# Altium schematic symbol library Sang_library.SchLib: 1607 symbols (part 11 of 15) (continued)
## Relay 5
designator RL?, comment Relay 10A/12V
Relay SPDT,10A - 12VDC 5 Pin; Value: Relay SPDT, 10A, 12V
footprint Relay - SRA-05VDC-CL (15.5 x 12.3 x 14mm)
footprint Relay - SRD-03VDC-SL-C (19.1 x 15.5 x 15.3mm)
pins: 1, 2, 3, 4, 5

## Relay 8
designator RL?
footprint RELAY 8
footprint RELAY 8 - 29*12.7
pins: 1, 2, 3, 4, 5, 6, 7, 8

## Relay 10A
designator RL?, comment MH  (value not drawn)
Cắm; Value: Relay ?V - 10A
footprint RELAY5PIN-10A
footprint RELAY5PIN-10A
pins: 1, 2, 3, 4, 5

## Relay 24V2A G5V
designator K?, comment 24V2A G5V
Cắm; Ten_Linh_Kien: Relay 24V2A 8 Chân G5V-2-24VDC; Don_Vi: Con; Ma_Hang: MH005637; Chung_Loai: Căm; Kieu_Chan: *; Ghi_Chu: *
footprint RELAY-DP
pins: 1, 2, 3, 4, 5, 6, 7, 8
text: +; -

## Relay 24V3A HK4100F
designator RL?, comment 24V3A SHG
Cắm; Ten_Linh_Kien: Relay 24V3A 6 Chân HK4100F-DC24V-SHG; Ma_Hang: MH001685; Don_Vi: Con; Kieu_Chan: *; Ghi_Chu: *; Chung_Loai: Cắm
footprint RELAY 6_MH (RELAY 6)
pins: 1, 2, 3, 4, 5, 6

## RELAY-DPST
designator K?, comment 24V3A SHG
Cắm; Ten_Linh_Kien: Relay 24V3A 6 Chân HK4100F-DC24V-SHG; Don_Vi: Con; Ma_Hang: MH001685; Kieu_Chan: *; Ghi_Chu: *; Chung_Loai: Cắm
pins: 1, 2, 3, 4, 5, 6

## RELAY-SPDT
designator K?, comment 5V10A
Cắm; Ten_Linh_Kien: Relay 5V10A 5 Chân SRD-05VDC-SL-C; Don_Vi: Con; Ma_Hang: MH001007; Kieu_Chan: *; Ghi _Chu: *; Chung_Loai: Cắm
footprint RELAY_5
pins: 1, 2, 3, 4, 5

## RELAY-SPST_n
designator K?, comment 24V10A
Cắm; Ten_Linh_Kien: Relay 24V10A G5Q-1A-DC24V; Don_Vi: Con; Ma_Hang: MH004501; Kieu_Chan: *; Ghi_Chu: *; Chung_Loai: Cắm
pins: 1, 2, 3, 5 4

## RELAY_12V_2A
designator K?, comment RELAY
Relay 8pin, 12V, 2A contact; CompanyID: VT-00250; Solder: HAND; Value: RELAY
footprint RY12W-K (Takamisawa Relay)
pins: 1, 2, 3, 4, 5, 6, 7, 8

## Relay_Module_1
designator *
footprint RELAY MODULE HW-279 2 RELAYS
pins: 1 IN, 2 V-, 3 V+, 4 NO, 5 COM, 6 NC
text: K1

## Res DIP
designator R?, comment Res
DIP; Manufacturer: Generic Components; Class: Passive; SubClass: R; Published: 08/06/2000; Publisher: Altium Hobart Technology Centre
footprint RES-1/2W
footprint RES-1/4W
footprint RES-1/4W-SMALL
footprint RES-1/4WD
footprint RES-1/8W
footprint RES-1/8W-SMALL (R 1/8W, 2 pin, 200mil)
footprint RES-1/8WD
footprint RES-1W
footprint RES-1W-LONG
footprint RES-1WD
footprint RES-2W (R2W, 2 pin, 700mil)
footprint RES-5W (R5W , 2 pin, 400 x 950mil)
footprint RES-5WD (R5W , 2 pin, 300 x 600 mil)
footprint RES-1/8W-SMALL-2 (R 1/8W, 2 pin, 200mil)
pins: 1, 2

## RES NTC DIP
designator R?, comment 10K
THERMISTOR NTC 10KOHM; MPN: 01M1002JF; MFR: Vishay Dale; Solder: Wave; Value: 10K; Category: RESISTOR
footprint RES NTC 10K
pins: 1, 2
text: +t

## Res RN4
designator RPB?, comment 10K
Resistor 4(Thanh); Value: Tro thanh 10K
footprint RN4 (R SIP5, 5 Pin)
pins: 1, 2, 3, 4, 5

## Res RN8
designator RPB?, comment 10K
Resistor 8 (Thanh); Value: Tro thanh 10K
footprint RN8 (R SIP8, 9 Pin)
pins: 1, 2, 3, 4, 5, 6, 7, 8, 9

## Res RN8_Dual
designator RPB?, comment 10K
Resistor 8 (Thanh); Value: Tro thanh 10K
footprint RN8_Dual (1206)
pins: 1, 2, 3, 4, 5, 6, 7, 8, 9, 10, 11, 12, 13, 14, 15, 16

## Res SMD
designator R?, comment Var
SMD; Manufacturer: Generic Components; Class: Passive; Published: 08/06/2000; Publisher: Altium Hobart Technology Centre
footprint RES-SMD-0101
footprint RES-SMD-0201
footprint RES-SMD-0603
footprint RES-SMD-0805
footprint RES-SMD-1206
footprint RES-SMD-1210 (Chip Capacitor, Body 3.2x2.5mm, IPC Medium Density)
footprint RES-SMD-1812 (Chip Capacitor, Body 3.2x2.5mm, IPC Medium Density)
footprint RES-SMD-2010 (Chip Capacitor, Body 3.2x2.5mm, IPC Medium Density)
footprint RES-SMD-2512 (Chip Capacitor, Body 3.2x2.5mm, IPC Medium Density)
footprint RES-SMD-0402
pins: 1, 2

## Res Var RV09
designator R?, comment RV09
Variable Resistor 10K; Value: 10K
footprint RES RV09
pins: 1, 2, 3
1 alternate drawing of the same symbol

## Res VR-DN
designator VR?, comment Var
Dual; Value: Volume Dual 50K
footprint VR-D1 (Volume control Dual)
footprint VR-D2
footprint VR-D3
footprint VR-D4
footprint VR-D5
footprint VR-D6
footprint VR-D7 (7*7mm, 10 position, 2.54mm, horizontal type, THT, Round  Arrow type, red actuator, real code, Tube)
pins: 1, 2, 3, 4, 5, 6
text: G

## Res VR-DP
designator VR?, comment 50K
Dual; Value: Volume Dual 50K
footprint VR-D1 (Volume control Dual)
footprint VR-D2
footprint VR-D3
footprint VR-D4
footprint VR-D5
footprint VR-D6
footprint VR-D7 (7*7mm, 10 position, 2.54mm, horizontal type, THT, Round  Arrow type, red actuator, real code, Tube)
part A pins: 1, 2, 3
part B pins: 4, 5, 6
part A text: G
part B text: G

## Res VR-NS
designator VR?
Var Res
footprint VR097NS
pins: 1, 2, 3, 4 CS1, 5 CS2

## Res VR-S
designator VR?, comment Var
Var Resistor; Value: Volume 50k
footprint VR-S4
footprint VR-S1
footprint VR-S2 (Resistor Variable)
footprint VR-S3 (Variable Resistor)
footprint VR 3x3
footprint RK097
pins: 1, 2, 3
text: G

## RF315-DEND-NOIC
designator C?
Manufacturer: W¨¹rth Elektronik eiSos GmbH; partNo: 613004143121; ComponentLink1 Description: Manufacturer; ComponentLink2 Description: Datasheet; NoPins: 04; Created Date: 29 March 2013; ComponentLink1URL: http://www.we-online.com; ComponentLink2URL: http://katalog.we-online.de/em/datasheet/6130xx143121.pdf; Created by: Karrer Zheng
footprint RF315-SEND-NOIC
pins: 1 DAT, 2 VCC, 3 GND
text: RF315-SE

## RF315-PT2272
designator C?
Manufacturer: W¨¹rth Elektronik eiSos GmbH; partNo: 613004143121; ComponentLink1 Description: Manufacturer; ComponentLink2 Description: Datasheet; NoPins: 04; Created Date: 29 March 2013; ComponentLink1URL: http://www.we-online.com; ComponentLink2URL: http://katalog.we-online.de/em/datasheet/6130xx143121.pdf; Created by: Karrer Zheng
footprint RF315-2272
pins: 1 VT, 2 D3, 3 D2, 4 D1, 5 D0, 6 VCC, 7 GND
text: RF315

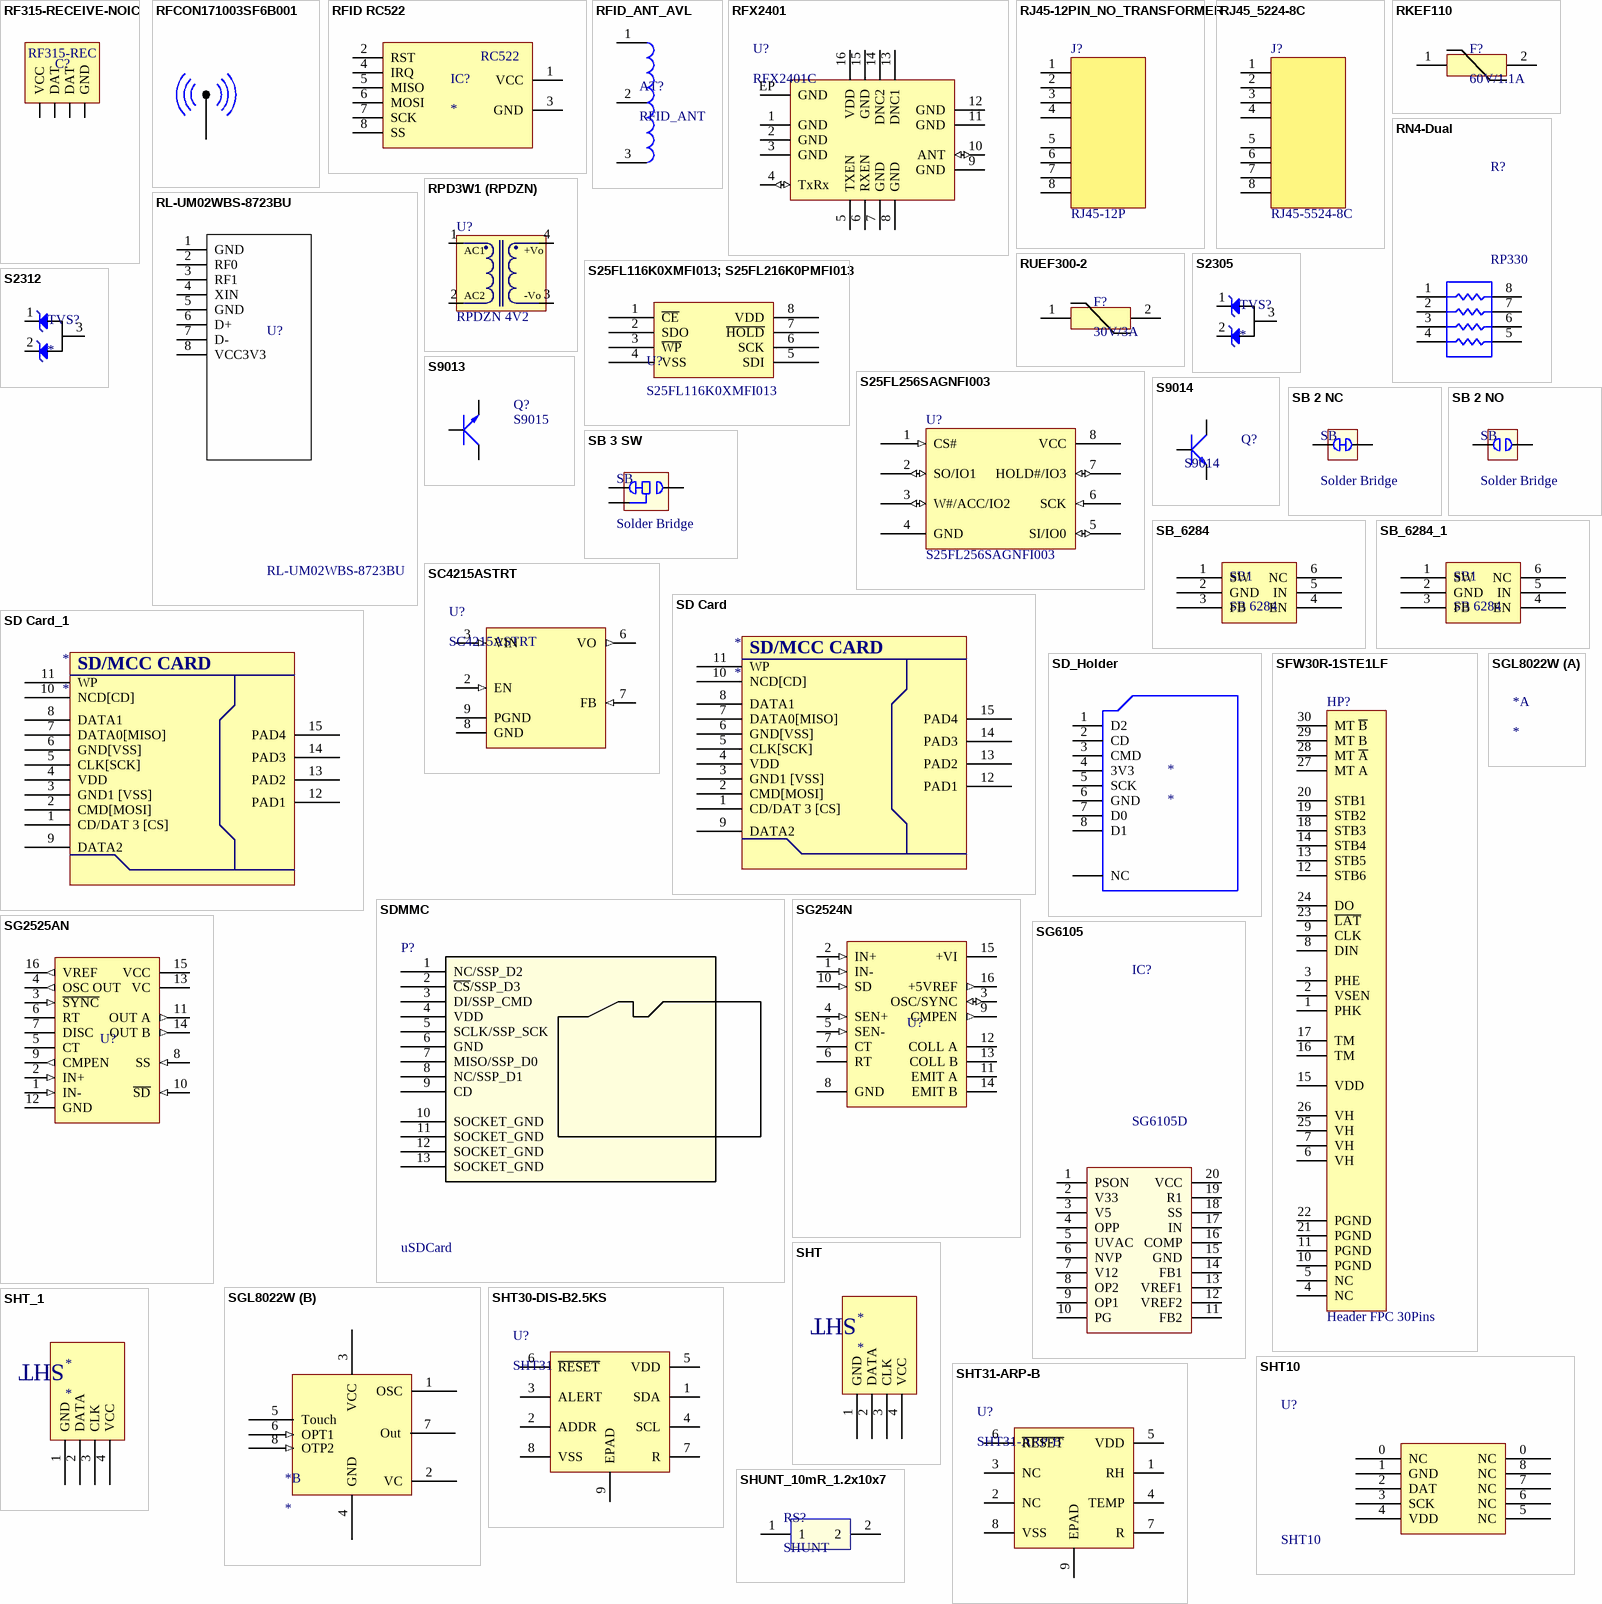
[diagram p69: symbols RF315-RECEIVE-NOIC to SHUNT_10mR_1.2x10x7]

## RF315-RECEIVE-NOIC
designator C?
Manufacturer: W¨¹rth Elektronik eiSos GmbH; partNo: 613004143121; ComponentLink1 Description: Manufacturer; ComponentLink2 Description: Datasheet; NoPins: 04; Created Date: 29 March 2013; ComponentLink1URL: http://www.we-online.com; ComponentLink2URL: http://katalog.we-online.de/em/datasheet/6130xx143121.pdf; Created by: Karrer Zheng
footprint RF315-RECEIVE-NOIC
pins: 1 VCC, 2 DAT, 3 DAT, 4 GND
text: RF315-REC

## RFCON171003SF6B001
designator AT?, comment AT-GSM-GPS  (value not drawn)
CONNECTER ANTENNA GPS GSM; MPN: RFCON171003SF6B001; Solder: HAND; CompanyID: VT-00392; Value: AT-GSM-GPS
footprint ANTENA - SMA2
pins: 1 AT, 2 hidden

## RFID RC522
designator IC?
pins: 1 VCC, 2 RST, 3 GND, 4 IRQ, 5 MISO, 6 MOSI, 7 SCK, 8 SS
text: RC522

## RFID_ANT_AVL
designator AT?, comment RFID_ANT  (net tie, no BOM)
footprint RFID_ANT_AVL (Footprint not found)
pins: 1, 2, 3

## RFX2401
designator U?, comment RFX2401C
2.4 GHz ZigBee®/ISM Front-End Module; Brand: SkyWork; Name VNET: VT_IC_RFX2401C; Part Number: RFX2401C
footprint QFN16 30X30 (QFN, 16-Leads, Body 3.00x3.00mm, Pitch 0.50mm, Thermal Pad 1.70x1.70mm, IPC Medium Density)
pins: 1 GND, 2 GND, 3 GND, 4 TxRx (io), 5 TXEN (power), 6 RXEN (power), 7 GND (power), 8 GND (power), 9 GND (power), 10 ANT (io), 11 GND, 12 GND, 13 DNC1, 14 DNC2, 15 GND, 16 VDD, EP GND (power)

## RJ45-12PIN_NO_TRANSFORMER
designator J?, comment RJ45-12P
Solder: WAVE
footprint RJ45-8PIN_18MM_NO_TRANSFORMER
pins: 1, 2, 3, 4, 5, 6, 7, 8

## RJ45_5224-8C
designator J?, comment RJ45-5524-8C
RJ45-12P; Solder: WAVE; MFR_URL: https://vi.aliexpress.com/item/80PCS-x-RJ45-5224-8C-Plastic-PCB-Modular-jack-Network-socket-LAN-CONNECTOR-plug-180degree-top/32722417191.html
footprint RJ45_5224-8C (Footprint not found)
pins: 1, 2, 3, 4, 5, 6, 7, 8

## RKEF110
designator F?, comment 60V/1.1A
PTC RESET FUSE 60V 1.1A RADIAL; MPN: RKEF110; MFR: Littelfuse Inc.; Solder: WAVE; Value: 60V/1.1A
footprint FUSE-RUEF300 (PTC Resettable Fuses - 3A)
pins: 1, 2

## RL-UM02WBS-8723BU
designator U?
IEEE 802.11b/g/n  1T1R WLAN and Bluetooth; Solder: SMT; MPN: RL-UM02WBS-8723BU; Value: RL-UM02WBS-8723BU; Category: IC
footprint RL-UM02WBS-8723BU
pins: 1 GND, 2 RF0, 3 RF1, 4 XIN, 5 GND, 6 D+, 7 D-, 8 VCC3V3

## RN4-Dual
designator R?, comment RP330
footprint RN4-1206
footprint RN4-0805
footprint RN4-0402 (Resistor network 4 x 1005 (0402))
pins: 1, 2, 3, 4, 5, 6, 7, 8

## RPD3W1 (RPDZN)
designator U?, comment RPDZN 4V2
Ultra-compact module power; MFR: No Brand; Solder: WAVE; Value: 4V2/700mA; Category: MODULE; MFR_URL: https://item.taobao.com/item.htm?spm=a230r.1.14.1.3e96105f3ARyPk&id=527538079756&ns=1&abbucket=16#detail; MPN: RPDZN 4V2; PinCount: 4
footprint RPD3W1 (RPDZN)
pins: 1 AC, 2, 3, 4
text: AC1; +Vo; AC2; -Vo

## RUEF300-2
designator F?, comment 30V/3A
PTC RESET FUSE 30V 3A RADIAL; MPN: RUEF300-2; MFR: Littelfuse Inc.; Solder: WAVE; CompanyID: VT-00887; Value: 30V/3A
footprint FUSE-RUEF300 (PTC Resettable Fuses - 3A)
pins: 1, 2

## S25FL116K0XMFI013; S25FL216K0PMFI013
designator U?, comment S25FL116K0XMFI013
Flash Memory 16Mb 3V 65MHz Serial NOR Flash; MPN: S25FL116K0XMFI013; S25FL216K0PMFI013; Solder: SMT; Value: S25FL116K0XMFI013; Category: IC
pins: 1 ~{CE}, 2 SDO, 3 ~{WP}, 4 VSS (power), 5 SDI, 6 SCK, 7 ~{HOLD}, 8 VDD (power)

## S25FL256SAGNFI003
designator U?
IC FLASH 256MBIT 133MHZ 8WSON; Solder: SMT; MPN: S25FL256SAGNFI003; Value: S25FL256SAGNFI003; Category: IC
footprint WSON-8 (6x8mm)
pins: 1 CS# (in), 2 SO/IO1 (io), 3 W#/ACC/IO2 (io), 4 GND (power), 5 SI/IO0 (io), 6 SCK (in), 7 HOLD#/IO3 (io), 8 VCC (power)

## S2305
designator TVS?
TVS DIODE 5VWM 10.8VC SOT23
footprint sot23-12_3
pins: 1, 2, 3

## S2312
designator TVS?
TVS DIODE 12VWM 19VC SOT23
footprint SOT23-12_3
pins: 1, 2, 3

## S9013
designator Q?, comment S9015
PNP 600mW, EBC; Value: C9015
footprint TO92-123 (TO-92)
footprint SOT23-231
footprint TO92-123 - 1 (TO-92)
footprint TO92-123 - 2 (TO-92)
footprint TO92-123 - 3 (TO-92)
pins: 1 E, 2 B, 3 C

## S9014
designator Q?
PNP 600mW, EBC; Value: C9014
footprint TO92-123 (TO-92)
footprint SOT23-231
footprint TO92-123 - 1 (TO-92)
footprint TO92-123 - 2 (TO-92)
footprint TO92-123 - 3 (TO-92)
pins: 1 E, 2 B, 3 C

## SB 2 NC
designator SB, comment Solder Bridge  (no BOM)
Solder Bridge 2; Solder: Not Fill; Value: Solder Bridge
footprint SB2_NC (Footprint not found)
pins: 1, 2

## SB 2 NO
designator SB, comment Solder Bridge  (no BOM)
Solder Bridge 2; Solder: Not Fill; Value: Solder Bridge
footprint SB2_NO (Footprint not found)
pins: 1, 2

## SB 3 SW
designator SB, comment Solder Bridge  (no BOM)
Solder Bridge 3; Solder: Not Fill; Value: Solder Bridge
footprint SB3_SW (Footprint not found)
pins: 1, 2, 3

## SB_6284
designator SB1, comment SB 6284
Dán
pins: 1 SW, 2 GND, 3 FB, 4 EN, 5 IN, 6 NC

## SB_6284_1
designator SB1, comment SB 6284
Dán
pins: 1 SW, 2 GND, 3 FB, 4 EN, 5 IN, 6 NC

## SC4215ASTRT
designator U?
IC REG LINEAR POS ADJ 2A 8SOIC; MFR: Semtech Corporation; Solder: SMT; MPN: SC4215ASTRT; Value: SC4215ASTRT; Category: IC
footprint SOIC-8-TP (SOIC 8 pin with Thermal Pad)
pins: 2 EN (in), 3 VIN (in), 6 VO (out), 7 FB (in), 8 GND, 9 TP hidden to PGND, 9 PGND

## SD Card
designator *
pins: 1 CD/DAT 3 [CS], 2 CMD[MOSI], 3 GND1 [VSS], 4 VDD, 5 CLK[SCK], 6 GND[VSS], 7 DATA0[MISO], 8 DATA1, 9 DATA2, 10 NCD[CD], 11 WP, 12 PAD1, 13 PAD2, 14 PAD3, 15 PAD4
text: SD/MCC CARD

## SD Card_1
designator *
pins: 1 CD/DAT 3 [CS], 2 CMD[MOSI], 3 GND1 [VSS], 4 VDD, 5 CLK[SCK], 6 GND[VSS], 7 DATA0[MISO], 8 DATA1, 9 DATA2, 10 NCD[CD], 11 WP, 12 PAD1, 13 PAD2, 14 PAD3, 15 PAD4
text: SD/MCC CARD

## SD_Holder
designator *
pins: 1 D2, 2 CD, 3 CMD, 4 3V3, 5 SCK, 6 GND, 7 D0, 8 D1, 9 NC

## SDMMC
designator P?, comment uSDCard
Micro SD Card Holder; MFR: GCT; MPN: MEM2055-00-190-01-A
footprint MEM2055-00-190-01-A (Footprint not found)
pins: 1 NC/SSP_D2, 2 ~{CS}/SSP_D3, 3 DI/SSP_CMD, 4 VDD, 5 SCLK/SSP_SCK, 6 GND, 7 MISO/SSP_D0, 8 NC/SSP_D1, 9 CD, 10 SOCKET_GND, 11 SOCKET_GND, 12 SOCKET_GND, 13 SOCKET_GND

## SFW30R-1STE1LF
designator HP?, comment Header FPC 30Pins
FPC 30Pins Pitch 1mm Connector Molex; MPN: SFW30R-1STE1LF; CompanyID: VT-00372; Solder: SMT; Value: Header FPC 30Pins
footprint FPC 30P 1MM (PFC 30Pins Pitch 1mm Connector)
pins: 1 PHK, 2 VSEN, 3 PHE, 4 NC, 5 NC, 6 VH, 7 VH, 8 DIN, 9 CLK, 10 PGND, 11 PGND, 12 STB6, 13 STB5, 14 STB4, 15 VDD, 16 TM, 17 TM, 18 STB3, 19 STB2, 20 STB1, 21 PGND, 22 PGND, 23 ~{LAT}, 24 DO, 25 VH, 26 VH, 27 MT A, 28 MT ~{A}, 29 MT B, 30 MT ~{B}

## SG2524N
designator U?
Regulating Pulse Width Modulator; Published: 24-Aug-2001; LatestRevisionDate: 06-Jun-2005; LatestRevisionNote: Stylized 3D Model Added.; DatasheetVersion: Dec-1995; PackageVersion: Apr-1996; PackageReference: DIP16; Publisher: Altium Limited; PackageDescription: DIP; 16 Leads; Row Spacing 7.62 mm; Pitch 2.54 mm; ComponentLink1Description: Manufacturer Link; ComponentLink1URL: http://www.st.com/
footprint DIP16
footprint SO16 (SOIC, 16-Leads, Body 9.90x3.91mm, Pitch 1.27mm, IPC Medium Density)
pins: 1 IN- (in), 2 IN+ (in), 3 OSC/SYNC (io), 4 SEN+ (in), 5 SEN- (in), 6 RT, 7 CT, 8 GND (power), 9 CMPEN (out), 10 SD (in), 11 EMIT A, 12 COLL A, 13 COLL B, 14 EMIT B, 15 +VI (power), 16 +5VREF (out)

## SG2525AN
designator U?
Regulating Pulse Width Modulator; Published: 24-Aug-2001; LatestRevisionDate: 06-Jun-2005; LatestRevisionNote: Stylized 3D Model Added.; DatasheetVersion: Jul-1998; PackageVersion: Apr-1996; PackageReference: DIP16; Publisher: Altium Limited; PackageDescription: DIP; 16 Leads; Row Spacing 7.62 mm; Pitch 2.54 mm; ComponentLink1Description: Manufacturer Link; ComponentLink1URL: http://www.st.com/; ComponentLink2Description: Datasheet; ComponentLink2URL: http://www.st.com/stonline/products/literature/ds/4286/sg2525.pdf
footprint DIP16 (DIP; 16 Leads; Row Spacing 7.62 mm; Pitch 2.54 mm)
footprint SO16 (SOIC, 16-Leads, Body 9.90x3.91mm, Pitch 1.27mm, IPC Medium Density)
pins: 1 IN- (in), 2 IN+ (in), 3 ~{SYNC} (in), 4 OSC OUT (out), 5 CT, 6 RT, 7 DISC (oc), 8 SS (in), 9 CMPEN (out), 10 ~{SD} (in), 11 OUT A (out), 12 GND (power), 13 VC (power), 14 OUT B (out), 15 VCC (power), 16 VREF (out)

## SG6105
designator IC?, comment SG6105D
Value: 16F88; Value: DIP18
footprint DIP20 (DIP 20, 20 PIN, W 300mil, Pin to pin 100mil)
pins: 1 PSON, 2 V33, 3 V5, 4 OPP, 5 UVAC, 6 NVP, 7 V12, 8 OP2, 9 OP1, 10 PG, 11 FB2, 12 VREF2, 13 VREF1, 14 FB1, 15 GND, 16 COMP, 17 IN, 18 SS, 19 R1, 20 VCC

## SGL8022W
designator *
footprint SO8 (SOIC, 8-Leads, Body 4.9x3.9mm, Pitch 1.27mm, IPC High Density)
footprint DIP8 (DIP, 8-Leads, Row Spacing 7.62mm, Pitch 2.54mm, Body 9.91x6.73mm)
part B pins: 1 OSC, 2 VC, 3 VCC (power), 4 GND (power), 5 Touch, 6 OPT1 (in), 7 Out, 8 OTP2 (in)

## SHT
designator *
pins: 1 GND, 2 DATA, 3 CLK, 4 VCC

## SHT10
designator U?
Humidity and Temperature Sensor IC; MFR: Sensirion; Solder: SMT; MPN: SHT10; Value: SHT10; Category: IC; PinCount: 10
footprint SHT10/11/15 (Footprint not found)
pins: 0 NC, 0 NC, 1 GND, 2 DAT, 3 SCK, 4 VDD, 5 NC, 6 NC, 7 NC, 8 NC

## SHT30-DIS-B2.5KS
designator U?, comment SHT31
SENSOR HUMID/TEMP 5V I2C 3% SMD; MPN: SHT30-DIS-B2.5KS; MFR: Sensirion AG
footprint SHT3x
pins: 1 SDA, 2 ADDR, 3 ALERT, 4 SCL, 5 VDD, 6 ~{RESET}, 7 R, 8 VSS, 9 EPAD

## SHT31-ARP-B
designator U?
SENSOR HUMID/TEMP 5V ANLG 2% SMD; MFR: Sensirion AG; MPN: SHT31-ARP-B
footprint SHT3x
pins: 1 RH, 2 NC, 3 NC, 4 TEMP, 5 VDD, 6 ~{RESET}, 7 R, 8 VSS, 9 EPAD

## SHT_1
designator *
pins: 1 GND, 2 DATA, 3 CLK, 4 VCC
text: SHT

## SHUNT_10mR_1.2x10x7
designator RS?, comment SHUNT
Shunt 10mR 1.2x10x7MM; Solder: HAND; MPN: Shunt 10mR 1.2x10x7MM; CompanyID: *; Value: 10mR
footprint Shunt 10mR 1.2x10x7MM (Footprint not found)
pins: 1, 2

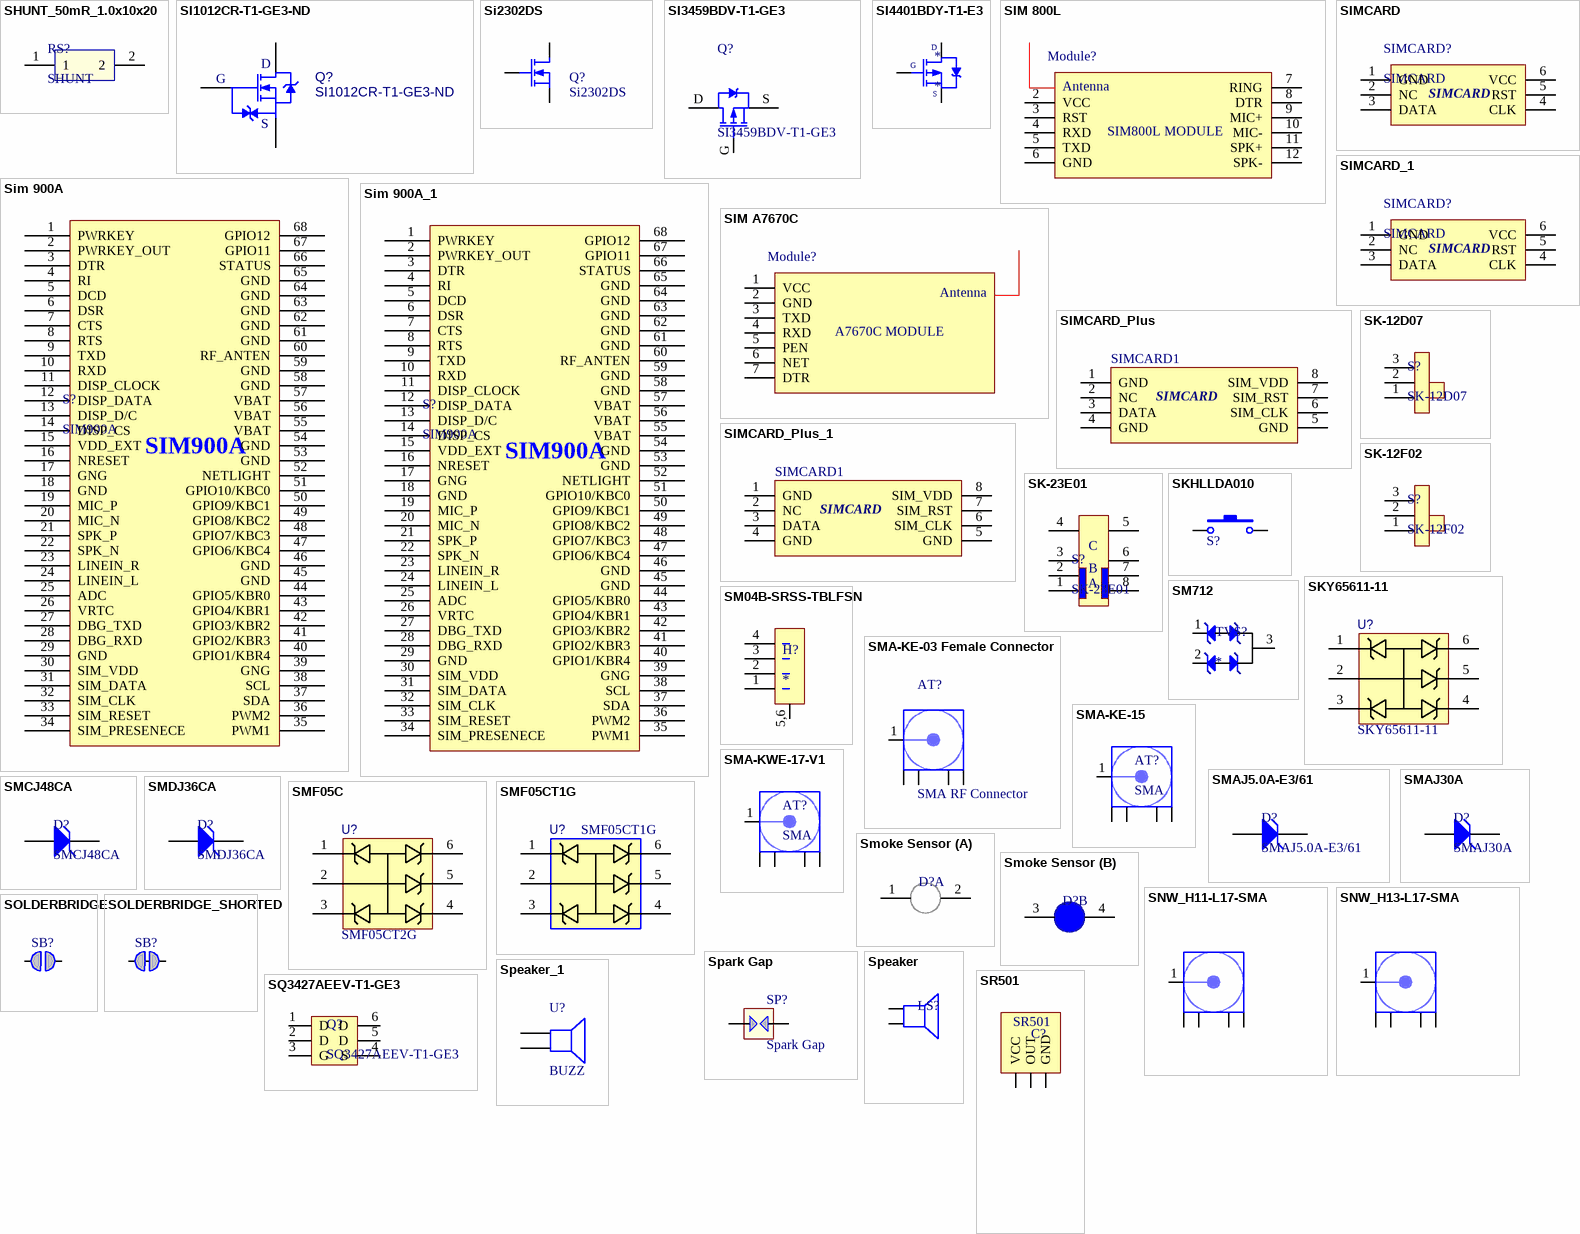
[diagram p70: symbols SHUNT_50mR_1.0x10x20 to SR501]

## SHUNT_50mR_1.0x10x20
designator RS?, comment SHUNT
SHUNT_50mR_1.0x10x20; MPN: Shunt 10mR 1.2x10x7MM; Solder: HAND; Value: 10mR; CompanyID: *
footprint Shunt 50mR 1.0x10x20MM
pins: 1, 2

## SI1012CR-T1-GE3-ND
designator Q?
MOSFET N-CH 20V 0.63A SC-75A; Solder: SMT; CompanyID: VT-01313; MPN: SI1012CR-T1-GE3-ND; Value: SI1012CR-T1-GE3-ND
footprint SOT-416 (NXP recommended footprint.)
pins: 1 G, 2 S, 3 D

## Si2302DS
designator Q?
N-Channel MOSFET; Published: 8-Jun-2000; LatestRevisionDate: 17-Jul-2002; LatestRevisionNote: Re-released for DXP Platform.; PackageVersion: 1995/1996; PackageReference: E3; Publisher: Altium Limited; PackageDescription: TO, Flat Index; 3 In-Line, Axial Leads; Body Dia. 4.6mm; Lead Dia. 0.5 mm (max)
footprint SOT23-132
pins: 1 G, 2 S, 3 D

## SI3459BDV-T1-GE3
designator Q?
MOSFET P-CH 60V 2.9A 6-TSOP; CompanyID: VT-01031; Solder: SMT; Value: SI3459BDV-T1-GE3; MPN: SI3459BDV-T1-GE3
footprint TSOP-6 - duplicate (TSOP, 6-Leads, Body 3.00x1.63mm, Pitch 0.95mm, IPC Medium Density)
pins: D, G, S

## SI4401BDY-T1-E3
designator *
footprint 8-SOIC
pins: 1,2,3 S, 4 G, 5,6,7,8 D

## SIM 800L
designator Module?  (value not drawn)
footprint SIM800L
pins: 2 VCC, 3 RST, 4 RXD, 5 TXD, 6 GND, 7 RING, 8 DTR, 9 MIC+, 10 MIC-, 11 SPK+, 12 SPK-
text: Antenna; SIM800L MODULE

## Sim 900A
designator S?, comment SIM900A
Dán; Don_Vi: Con; Ma_Hang: MH001813; Ten_Linh_Kien: SIM900A; Ghi_Chu: *; Kieu_Chan: *; Chung_Loai: Dán
footprint sim900
pins: 1 PWRKEY, 2 PWRKEY_OUT, 3 DTR, 4 RI, 5 DCD, 6 DSR, 7 CTS, 8 RTS, 9 TXD, 10 RXD, 11 DISP_CLOCK, 12 DISP_DATA, 13 DISP_D/C, 14 DISP_CS, 15 VDD_EXT, 16 NRESET, 17 GNG, 18 GND, 19 MIC_P, 20 MIC_N, 21 SPK_P, 22 SPK_N, 23 LINEIN_R, 24 LINEIN_L, 25 ADC, 26 VRTC, 27 DBG_TXD, 28 DBG_RXD, 29 GND, 30 SIM_VDD, 31 SIM_DATA, 32 SIM_CLK, 33 SIM_RESET, 34 SIM_PRESENECE, 35 PWM1, 36 PWM2, 37 SDA, 38 SCL, 39 GNG, 40 GPIO1/KBR4, 41 GPIO2/KBR3, 42 GPIO3/KBR2, 43 GPIO4/KBR1, 44 GPIO5/KBR0, 45 GND, 46 GND, 47 GPIO6/KBC4, 48 GPIO7/KBC3, 49 GPIO8/KBC2, 50 GPIO9/KBC1, 51 GPIO10/KBC0, 52 NETLIGHT, 53 GND, 54 GND, 55 VBAT, 56 VBAT, 57 VBAT, 58 GND, 59 GND, 60 RF_ANTEN, 61 GND, 62 GND, 63 GND, 64 GND, 65 GND, 66 STATUS, 67 GPIO11, 68 GPIO12

## Sim 900A_1
designator S?, comment SIM900A
Dán; Don_Vi: Con; Ma_Hang: MH001813; Ten_Linh_Kien: SIM900A; Ghi_Chu: *; Kieu_Chan: *; Chung_Loai: Dán
footprint sim900
pins: 1 PWRKEY, 2 PWRKEY_OUT, 3 DTR, 4 RI, 5 DCD, 6 DSR, 7 CTS, 8 RTS, 9 TXD, 10 RXD, 11 DISP_CLOCK, 12 DISP_DATA, 13 DISP_D/C, 14 DISP_CS, 15 VDD_EXT, 16 NRESET, 17 GNG, 18 GND, 19 MIC_P, 20 MIC_N, 21 SPK_P, 22 SPK_N, 23 LINEIN_R, 24 LINEIN_L, 25 ADC, 26 VRTC, 27 DBG_TXD, 28 DBG_RXD, 29 GND, 30 SIM_VDD, 31 SIM_DATA, 32 SIM_CLK, 33 SIM_RESET, 34 SIM_PRESENECE, 35 PWM1, 36 PWM2, 37 SDA, 38 SCL, 39 GNG, 40 GPIO1/KBR4, 41 GPIO2/KBR3, 42 GPIO3/KBR2, 43 GPIO4/KBR1, 44 GPIO5/KBR0, 45 GND, 46 GND, 47 GPIO6/KBC4, 48 GPIO7/KBC3, 49 GPIO8/KBC2, 50 GPIO9/KBC1, 51 GPIO10/KBC0, 52 NETLIGHT, 53 GND, 54 GND, 55 VBAT, 56 VBAT, 57 VBAT, 58 GND, 59 GND, 60 RF_ANTEN, 61 GND, 62 GND, 63 GND, 64 GND, 65 GND, 66 STATUS, 67 GPIO11, 68 GPIO12

## SIM A7670C
designator Module?  (value not drawn)
footprint SIM A7670C
pins: 1 VCC, 2 GND, 3 TXD, 4 RXD, 5 PEN, 6 NET, 7 DTR
text: Antenna; A7670C MODULE

## SIMCARD
designator SIMCARD?
footprint SIMCARD (SOCKET Khe Cam The Sim)
pins: 1 GND, 2 NC, 3 DATA, 4 CLK, 5 RST, 6 VCC

## SIMCARD_1
designator SIMCARD?, comment SIMCARD
footprint SIMCARD (SOCKET Khe Cam The Sim)
pins: 1 GND, 2 NC, 3 DATA, 4 CLK, 5 RST, 6 VCC

## SIMCARD_Plus
designator SIMCARD1  (value not drawn)
footprint SIM Card Plus
pins: 1 GND, 2 NC, 3 DATA, 4 GND, 5 GND, 6 SIM_CLK, 7 SIM_RST, 8 SIM_VDD
text: SIMCARD

## SIMCARD_Plus_1
designator SIMCARD1, comment SIMCARD_Plus  (value not drawn)
footprint SIM Card Plus
pins: 1 GND, 2 NC, 3 DATA, 4 GND, 5 GND, 6 SIM_CLK, 7 SIM_RST, 8 SIM_VDD
text: SIMCARD

## SK-12D07
designator S?
footprint SK-12D07
pins: 1 + (power), 2 + (power), 3 + (power)

## SK-12F02
designator S?
footprint SK-12F02 (Footprint not found)
pins: 1 + (power), 2 + (power), 3 + (power)

## SK-23E01
designator S?
footprint SK-23E01 (Footprint not found)
pins: 1 + (power), 2 + (power), 3 + (power), 4 + (power), 5 + (power), 6 + (power), 7 + (power), 8 + (power)
text: C; B; A

## SKHLLDA010
designator S?, comment SW  (value not drawn)
Switch 3*6*5 vertical; Value: BUTTON2; Solder: HAND
footprint SKHLLDA010 (Length 7mm)
pins: 1, 2

## SKY65611-11
designator U?
IC AMP GPS 1.559GHZ-1.61GHZ 6DFN; MFR: Skyworks Solutions Inc.; Solder: SMT; CompanyID: VT-0; MPN: SKY65611-11; Category: IC; Value: SKY65611-11; PinCount: 6
footprint SOT65P210X140-6N (SOT23, 6-Leads, Body 2.00x2.10mm, Pitch 0.65mm, IPC Medium Density)
pins: 1 CT1, 2 AN, 3 CT2, 4 CT3, 5 CT4, 6 CT5

## SM04B-SRSS-TBLFSN
designator H?
footprint CONN_SM04B_JST
pins: 1, 2, 3, 4, 5,6

## SM712
designator TVS?
7V/12V TVS,PACKAGE SOT-23, TVS A
footprint SOT23-12_3
pins: 1, 2, 3

## SMA-KE-03 Female Connector
designator AT?, comment SMA RF Connector
SMA-KE-03 Female Connector; CompanyID: VT-01109; Solder: WAVE; Value: SMA RF Connector; MFR_URL: http://thegioiic.com/products/sma-ke-03-female-connector
footprint SMA-KE-03 Female Connector
pins: 1 Signal "Signal Pin", 2 (power), 2 (power), 2 (power), 2 (power)

## SMA-KE-15
designator AT?, comment SMA
MPN: SMA-KE-15; Solder: WAVE; MFR_URL: https://detail.tmall.com/item.htm?spm=a230r.1.14.22.507e4d4blv2K4G&id=544393214226&ns=1&abbucket=6
footprint SMA-KE-15
pins: 1 Signal "Signal Pin", 2 (power), 2 (power), 2 (power), 2 (power)

## SMA-KWE-17-V1
designator AT?, comment SMA
MPN: SMA-KWE-17-V1; Solder: WAVE
footprint SMA-KWE-17-V1
pins: 1 Signal "Signal Pin", 2 (power), 2 (power), 2 (power), 2 (power)

## SMAJ5.0A-E3/61
designator D?
DIODE TVS 5VWM 9.2VC SMA; Solder: SMT; CompanyID: VT-00317; Value: SMAJ5.0A-E3/61; MPN: SMAJ5.0A-E3/61
footprint DIODE_DO214AC_SMA (Diode 2214AC)
pins: 1 A, 2 K

## SMAJ30A
designator D?
TVS DIODE 30V 48.4V DO214AC; MFR: Littelfuse Inc.; Solder: SMT; Value: SMAJ30A; MPN: SMAJ30A
footprint DIODE_DO214AC_SMA (Diode 2214AC)
pins: 1 A, 2 K

## SMCJ48CA
designator D?
TVS DIODE 48V 77.4V DO214AB; MFR: Littelfuse Inc.; Solder: SMT; Value: SMCJ48CA; MPN: SMCJ48CA; PinCount: 2
footprint DIODE_DO214AB_SMC (SMC Type)
pins: 1 A, 2 K

## SMDJ36CA
designator D?
DIODE TVS 36VWM 58.1VC 3KW SMD; CompanyID: VT-00912; Solder: SMT; Value: SMDJ36CA; MPN: SMDJ36CA
footprint DIODE_DO214AB_SMC (SMC Type)
pins: 1 A, 2 K

## SMF05C
designator U?, comment SMF05CT2G
TVS Diode Array For ESD and Latch-Up Protection; MFR: ON SEMICONDUCTOR; Solder: SMT; CompanyID: VT-0; MPN: SMF05CT2G; Category: IC; Value: SMF05CT2G
footprint SOT65P210X140-6N (SOT23, 6-Leads, Body 2.00x2.10mm, Pitch 0.65mm, IPC Medium Density)
pins: 1 CT1, 2 AN, 3 CT2, 4 CT3, 5 CT4, 6 CT5

## SMF05CT1G
designator U?
TVS DIODE 5VWM 12.5VC SC88; CompanyID: VT-00105; Solder: SMT; MPN: SMF05CT1G; Value: SMF05CT1G
footprint SOT363 (Small Outline Transistor (SOT23), 0.65 mm pitch; 6 pin, 2.00 mm L X 1.25 mm W X 1.10 mm H body)
pins: 1 CT1, 2 AN, 3 CT2, 4 CT3, 5 CT4, 6 CT5

## Smoke Sensor
designator D?
footprint Smoke Sensor
part A pins: 1 A, 2 K
part B pins: 3 A, 4 K

## SNW_H11-L17-SMA
designator AT?, comment AT-GSM-GPS  (value not drawn)
CONNECTER ANTENNA GPS GSM; MPN: SNW_H11-L17-SMA; MFR: Sunny Way; Solder: HAND; Value: AT-GSM-GPS
footprint SNW_H11-L17-SMA (Footprint not found)
pins: 1 Signal "Signal Pin", 2 hidden, 2 (power), 2 (power), 2 (power), 2 (power)

## SNW_H13-L17-SMA
designator AT?, comment AT-GSM-GPS  (value not drawn)
CONNECTER ANTENNA GPS GSM; MPN: SNW_H13-L17-SMA; MFR: Sunny Way; Solder: HAND; Value: AT-GSM-GPS
footprint SNW_H13-L17-SMA (Footprint not found)
pins: 1 Signal "Signal Pin", 2 hidden, 2 (power), 2 (power), 2 (power), 2 (power)

## SOLDERBRIDGE
designator SB?, comment Solderbridge  (value not drawn)  (no BOM)
Artikkelnr Noca: N.A.; Part Number: Solderbridge; Manufacturer: *; Manufacturer Part Number: *; Footprint Doc: Solderbridge; LatestRevisionDate: 2009-12-14; Pin Count: 2; Publisher: Nordic Semiconductor; Published: 2009-12-14; Value: Solderbridge; Note: *; Supplier: *; Supplier part number: *; 2nd source Supplier: *; 2nd source part number: *; Artikkelnr Simpro: N.A.; ComponentLink1Description: Datasheet; ComponentLink1URL: *; ComponentLink2Description: Supplier link; ComponentLink2URL: *; HelpURL: *
footprint Solderbridge
pins: 1 0, 2 1

## SOLDERBRIDGE_SHORTED
designator SB?, comment Solderbridge  (value not drawn)  (net tie, no BOM)
Shorted Solderbridge; Part Number: Solderbridge Shorted; Artikkelnr Noca: N.A.; Manufacturer: *; Manufacturer Part Number: *; Footprint Doc: Solderbridge_Shorted; LatestRevisionDate: 2012-08-07; Pin Count: 2; Publisher: Nordic Semiconductor; Published: 2012-08-07; Value: Solderbridge; Note: *; Supplier: *; Supplier part number: *; 2nd source Supplier: *; 2nd source part number: *; Artikkelnr Simpro: N.A.; ComponentLink1Description: Datasheet; ComponentLink1URL: *; ComponentLink2Description: Supplier link; ComponentLink2URL: *; HelpURL: *
footprint Solderbridge_Shorted
pins: 1 0, 2 1

## Spark Gap
designator SP?  (no BOM)
Solder: Not Fill; Value: Spark Gap
footprint SPARK GAP
footprint SPARK GAP
pins: 1, 2

## Speaker
designator LS?
Loudspeaker; Published: 24-Mar-1999; LatestRevisionDate: 17-Jul-2002; LatestRevisionNote: Re-released for DXP Platform.; PackageReference: PIN2; Publisher: Altium Limited
footprint SPEAKER
footprint SPK (Speaker Chip)
footprint SP1 (Speaker Telphone on Broad)
pins: 1, 2

## Speaker_1
designator U?, comment BUZZ
Loudspeaker
footprint BUZZER_D9_TH
footprint BUZZER_through_hole
pins: 1, 2

## SQ3427AEEV-T1-GE3
designator Q?
MOSFET P-CH 60V 5.3A 6TSOP; Solder: SMT; CompanyID: VT-00378; Value: SQ3427AEEV-T1-GE3; MPN: SQ3427AEEV-T1-GE3
footprint TSOP-6 (TSOP, 6-Leads, Body 3.00x1.63mm, Pitch 0.95mm, IPC Medium Density)
pins: 1 D, 2 D, 3 G, 4 S, 5 D, 6 D

## SR501
designator C?
Manufacturer: W¨¹rth Elektronik eiSos GmbH; partNo: 613003143121; ComponentLink1 Description: Manufacturer; ComponentLink2 Description: Datasheet; NoPins: 03; Created Date: 29 March 2013; ComponentLink1URL: http://www.we-online.com; ComponentLink2URL: http://katalog.we-online.de/em/datasheet/6130xx143121.pdf; Created by: Karrer Zheng
footprint SR501
pins: 1 VCC, 2 OUT, 3 GND
